# Altium footprint library NUCLEO-F401RE.PcbLib: 1 footprints
Each footprint in its own frame and in the unit in brackets; x right, y up, seen from the top. Pads: shape width x height; smd on the part's side, far side on the other; paste and mask are expansions set on the pad; w line width, h text height; cw(c..) or ccw(c..) is an arc to the next point about the centre after c.
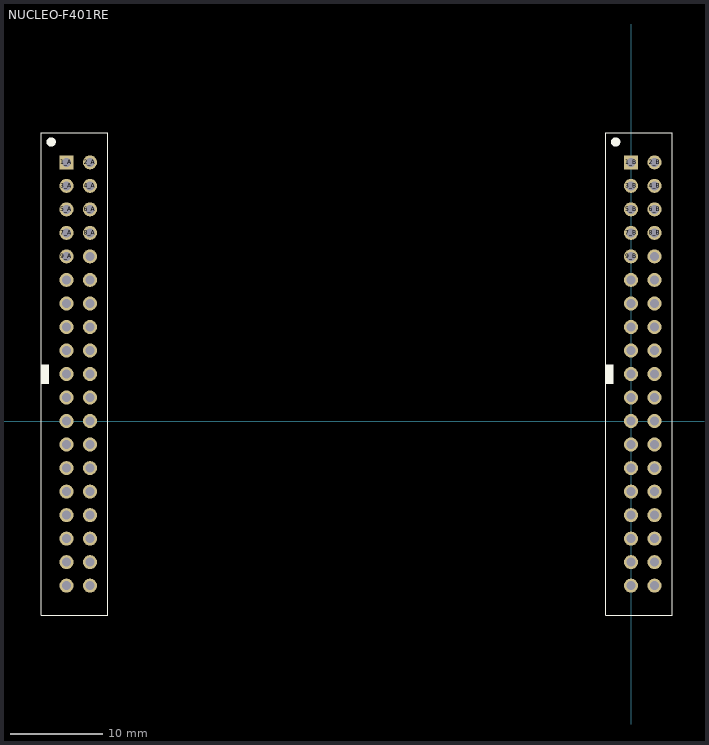
[diagram p0: the footprint, top view; thin cyan lines are the x and y axes]

## NUCLEO-F401RE [mil]
pads (76):
  rect 60x60 hole 38: 1_A(-2400,1100) 1_B(0,1100)
  round 60 hole 38: 2_A(-2300,1100) 2_B(100,1100) 3_A(-2400,1000) 3_B(0,1000) 4_A(-2300,1000) 4_B(100,1000) 5_A(-2400,900) 5_B(0,900) 6_A(-2300,900) 6_B(100,900) 7_A(-2400,800) 7_B(0,800) 8_A(-2300,800) 8_B(100,800) 9_A(-2400,700) 9_B(0,700) 10_A(-2300,700) 10_B(100,700) 11_A(-2400,600) 11_B(0,600) 12_A(-2300,600) 12_B(100,600) 13_A(-2400,500) 13_B(0,500) 14_A(-2300,500) 14_B(100,500) 15_A(-2400,400) 15_B(0,400) 16_A(-2300,400) 16_B(100,400) 17_A(-2400,300) 17_B(0,300) 18_A(-2300,300) 18_B(100,300) 19_A(-2400,200) 19_B(0,200) 20_A(-2300,200) 20_B(100,200) 21_A(-2400,100) 21_B(0,100) 22_A(-2300,100) 22_B(100,100) 23_A(-2400,0) 23_B(0,0) 24_A(-2300,0) 24_B(100,0) 25_A(-2400,-100) 25_B(0,-100) 26_A(-2300,-100) 26_B(100,-100) 27_A(-2400,-200) 27_B(0,-200) 28_A(-2300,-200) 28_B(100,-200) 29_A(-2400,-300) 29_B(0,-300) 30_A(-2300,-300) 30_B(100,-300) 31_A(-2400,-400) 31_B(0,-400) 32_A(-2300,-400) 32_B(100,-400) 33_A(-2400,-500) 33_B(0,-500) 34_A(-2300,-500) 34_B(100,-500) 35_A(-2400,-600) 35_B(0,-600) 36_A(-2300,-600) 36_B(100,-600) 37_A(-2400,-700) 37_B(0,-700) 38_A(-2300,-700) 38_B(100,-700)
Top Overlay:
  circle w20: c-2465.5,1186.5 r10
  circle w20: c-65.5,1186.5 r10
  region: -2507.48,239.37 -2507.48,160.63 -2475,160.63 -2475,239.37
  region: -107.48,239.37 -107.48,160.63 -75,160.63 -75,239.37
  lines w5: -2507.48,160.63 -2475,160.63 -2475,239.37 -2507.48,239.37 ; -107.48,160.63 -75,160.63 -75,239.37 -107.48,239.37 ; -2507.48,-825 -2225,-825 -2225,1225 -2507.48,1225 -2507.48,-825 ; -107.48,-825 175,-825 175,1225 -107.48,1225 -107.48,-825
3D body "female_header_a-bl254-dg-g14d.stp": height 334.65, standoff -125.98, extent -2448.42,-764.92 -2251.57,-55.08
3D body "female_header_a-bl254-dg-g14d.stp": height 334.65, standoff -125.98, extent -2448.42,-154.92 -2251.57,554.92
3D body "female_header_a-bl254-dg-g14d.stp": height 334.65, standoff -125.98, extent -2448.42,445.08 -2251.57,1154.92
3D body "female_header_a-bl254-dg-g14d.stp": height 334.65, standoff -125.98, extent -48.42,-764.92 148.43,-55.08
3D body "female_header_a-bl254-dg-g14d.stp": height 334.65, standoff -125.98, extent -48.42,-154.92 148.43,554.92
3D body "female_header_a-bl254-dg-g14d.stp": height 334.65, standoff -125.98, extent -48.42,445.08 148.43,1154.92
3D body "NUCLEO-F411RE.STEP": height 845.87, standoff 47.83, extent -2525.91,-900 230,2405.71